# Altium footprint library 布洛电子PCB封装库-电阻电容电感.PcbLib: 59 footprints (part 3 of 4)
Each footprint in its own frame and in the unit in brackets; x right, y up, seen from the top. Pads: shape width x height; smd on the part's side, far side on the other; paste and mask are expansions set on the pad; w line width, h text height; cw(c..) or ccw(c..) is an arc to the next point about the centre after c.
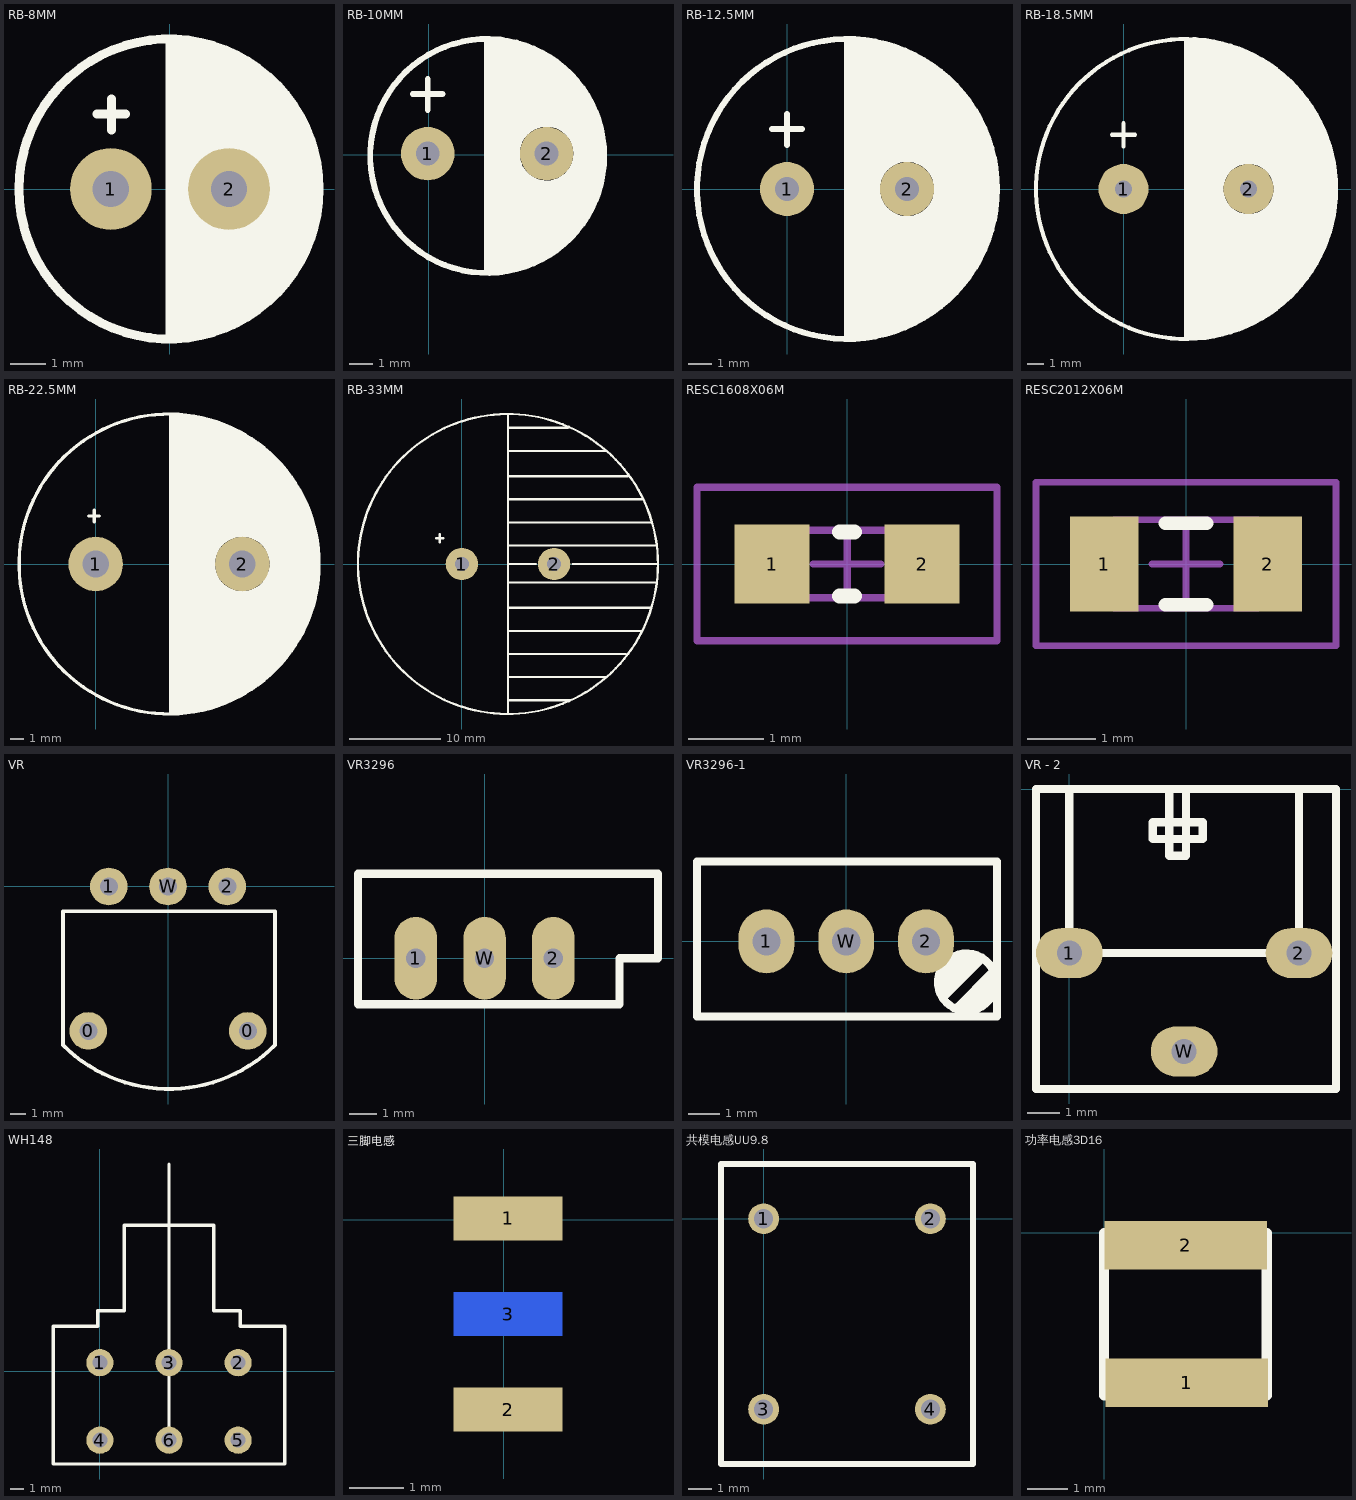
[diagram p2: the footprints below, top view; thin cyan lines are the x and y axes]

## RB-8MM [mil]
pads (2):
  round 90 hole 40: 1(-65,0) 2(65,0)
Top Overlay:
  circle w10: c-1,0 r165
  lines w10: -80.31,82.28 -48.82,82.28 ; -64.17,64.96 -64.17,99.21 ; 0,-165 0,164 ; 7,162 7,-161 8,-162 16,-162 16,158 25,158 25,-158 34,-158 34,156 43,156 43,-154 52,-154 52,151 61,151 61,-149 70,-149 70,144 78,136 78,-141 87,-132 87,135 96,126 96,-131 105,-122 105,124 114,115 114,-115 123,-106 123,-104 123,106 132,97 132,-96 ; 140,-82 140,79 140,67 149,58 149,-65 ; 157,-41 157,43
3D body: height 472.44, standoff -98.43, extent -158,-157.96 156.96,157

## RB-10MM [mil]
pads (2):
  round 90 hole 40: 1(-2,2) 2(198,2)
Top Overlay:
  circle w10: c198,2 r50
  circle w50: c198,2 r76.16
  circle w10: c98,-2 r196.85
  lines w10: -27.2,102 23.2,102 ; -2,75.62 -2,127.2 ; 98,193 98,-195 98,77 108,87
  lines w50: 118,-48 ccw(c223,-8) 227.2,-120.28 ; 118,132 cw(c150.5,69.5) 213,102 ; 118,151 cw(c150.5,88.5) 213,121 ; 120.18,-170.85 cw(c145.5,-175.5) 123,-163 ; 123,-118 ccw(c183,-123) 141.66,-166.77 ; 123,-88 ccw(c213,-68) 173,-151.07 ; 123,52 cw(c148,57) 143,82 ; 123,97 cw(c155.5,64.5) 188,97 ; 133,-28 ccw(c223,22) 251,-77.08 ; 134,139 cw(c166.5,76.5) 229,109 ; 160,101 cw(c192.5,38.5) 255,71 ; 118,174 ccw(c150.5,111.5) 118,174 ; 120,-177 ccw(c152.5,-239.5) 120,-177 ; 136,165 ccw(c168.5,102.5) 136,165 ; 152,-165 ccw(c184.5,-227.5) 152,-165 ; 162,-157 ccw(c194.5,-219.5) 162,-157 ; 181,-153 ccw(c213.5,-215.5) 181,-153 ; 204,-141 ccw(c236.5,-203.5) 204,-141 ; 244,-95 ccw(c276.5,-157.5) 244,-95 ; 262,-59 ccw(c294.5,-121.5) 262,-59

## RB-12.5MM [mil]
pads (2):
  round 90 hole 40: 1(0,0) 2(200,0)
Top Overlay:
  circle w50: c200,0 r76.16
  circle w10: c200,0 r50
  circle w10: c100,0 r250
  lines w10: -25.2,100 25.2,100 ; 0,73.62 0,125.2 ; 100,-250 100,245 ; 110,-245 100,-235 100,75 110,85 110,235 100,245 ; 120,245 100,245
  lines w50: 120,-50 ccw(c225,-10) 265,-115 ; 120,130 cw(c152.5,67.5) 215,100 ; 120,165 cw(c147.5,62.5) 250,90 ; 120,195 cw(c125,30) 290,35 ; 120,220 cw(c110,10) 320,0 cw(c110,-15) 125,-225 cw(c132.5,-217.5) 125,-210 ; 125,-165 ccw(c147.5,-177.5) 135,-200 ; 125,-120 ccw(c185,-125) 180,-185 ; 125,-90 ccw(c215,-70) 235,-160 ; 125,50 cw(c150,55) 145,80 ; 125,95 cw(c157.5,62.5) 190,95 ; 135,-30 ccw(c225,20) 275,-70 ; 285,-80 ccw(c270,-55) 295,-40

## RB-18.5MM [mil]
pads (2):
  round 120 hole 40: 1(0,0) 2(300,0)
Top Overlay:
  circle w50: c300,0 r103.08
  circle w10: c300,0 r75.17
  circle w10: c150,0 r360
  circle w50: c300,0 r85
  lines w10: -27.56,130.31 27.56,130.31 ; 0,102.36 0,157.87 ; 150,-360 150,360
  lines w15: 185,-320 185,-275
  lines w50: 170,-295 ccw(c197.5,-282.5) 210,-310 ; 170,-285 ccw(c162.5,-7.5) 440,0 ; 170,-245 ccw(c195,-45) 395,-70 ; 170,280 cw(c180,20) 440,30 ; 170,330 cw(c162.5,7.5) 485,0 ; 170,340 170,-335 ccw(c152.5,-7.5) 480,10 ; 180,-205 ccw(c207.5,-77.5) 335,-105 ; 180,-170 ccw(c207.5,-92.5) 285,-120 ; 180,240 cw(c202.5,42.5) 400,65 ; 185,-135 ccw(c205,-90) 250,-110 ; 185,-100 ccw(c200,-80) 220,-95 ; 185,135 cw(c240,100) 275,155 ; 185,190 cw(c235,110) 315,160 ; 195,-70 ccw(c215,-65) 220,-85 ; 195,90 cw(c287.5,27.5) 350,120 ; 200,-25 ccw(c235,-30) 230,-65 ; 315,-105 ccw(c355,-65) 395,-105

## RB-22.5MM [mil]
pads (2):
  round 160 hole 78: 1(0,0) 2(430,0)
Top Overlay:
  circle w100: c430,0 r129.71
  circle w10: c215,0 r440
  rectangle: 355,-80 370,-55
  rectangle: 305,-130 360,-40
  rectangle: 375,160 390,405
  rectangle: 355,145 375,415
  rectangle: 340,145 360,420
  rectangle: 315,120 345,425
  rectangle: 290,-430 325,430
  rectangle: 250,-435 295,435
  rectangle: 215,-440 250,435
  lines w10: -20.43,140.71 11.06,140.71 ; -4.29,123.39 -4.29,157.64
  lines w100: 270,-390 ccw(c240,-90) 540,-60 ; 275,315 cw(c352.5,122.5) 545,200 cw(c355,55) 340.8,-183.59 ; 305,-360 ccw(c305,-100) 565,-100 ; 305,-255 ccw(c401.2,-96.27) 566.2,-181.27 ; 316.17,-192.07 ccw(c395,5) 600,60 ; 330,235 cw(c372.5,87.5) 520,130 ; 360,170 cw(c420,120) 470,180 ; 360,365 cw(c200,5) 560,-155 ; 508.27,-174.94 ccw(c505,-80) 600,-80

## RB-33MM [mil]
pads (2):
  round 140 hole 60: 1(0,0) 2(400,0)
Top Overlay:
  circle w10: c200,0 r650
  lines w10: -111.42,111.42 -79.92,111.42 ; -95.28,94.09 -95.28,128.35 ; 200,-650 200,650 ; 200,-590 470,-590 ; 200,-490 620,-490 ; 200,-390 710,-390 ; 200,-290 780,-290 ; 200,-190 820,-190 ; 200,-80 840,-80 ; 200,0 320,0 ; 200,80 840,80 ; 200,180 820,180 ; 200,280 780,280 ; 200,380 720,380 ; 200,490 620,490 ; 200,590 460,590 ; 480,0 850,0

## RESC1608X06M [mm] "Chip Resistor, 2-Leads, Body 1.6x0.8mm, IPC Low Density"
height 0.6
pads (2):
  rect 1x1.05 smd: 1(-1,0) 2(1,0)
Top Overlay:
  lines w0.2: -0.1,-0.425 0.1,-0.425 ; -0.1,0.425 0.1,0.425
Mechanical 13:
  lines w0.1: -0.85,-0.45 0.85,-0.45 0.85,0.45 -0.85,0.45 -0.85,-0.45
Mechanical 15:
  lines w0.1: -0.45,0 0.45,0 ; 0,-0.45 0,0.45 ; -2,-1.025 2,-1.025 2,1.025 -2,1.025 -2,-1.025
3D body: height 0.55, standoff 0, extent -0.8,-0.4 0.8,0.4

## RESC2012X06M [mm] "Chip Resistor, 2-Leads, Body 2.0x1.2mm, IPC Low Density"
height 0.6
pads (2):
  rect 1x1.4 smd: 1(-1.2,0) 2(1.2,0)
Top Overlay:
  lines w0.2: -0.3,-0.6 0.3,-0.6 ; -0.3,0.6 0.3,0.6
Mechanical 13:
  lines w0.1: -1.05,-0.65 1.05,-0.65 1.05,0.65 -1.05,0.65 -1.05,-0.65
Mechanical 15:
  lines w0.1: -0.5,0 0.5,0 ; 0,-0.5 0,0.5 ; -2.2,-1.2 2.2,-1.2 2.2,1.2 -2.2,1.2 -2.2,-1.2
3D body: height 1, standoff 0, extent -1,-0.6 1,0.6

## VR [mm]
pads (5):
  round 2.5 hole 1.2: 0(-5.3,-9.6) 0(5.3,-9.6) 1(-3.937,0) 2(3.937,0) W(0,0)
Top Overlay:
  lines w0.254: -6.985,-10.541 ccw(c0.064,-3.492) 7.112,-10.541 7.112,-1.651 -6.985,-1.651 -6.985,-10.414
3D body: height 5.75, standoff 1.05, extent -8.89,-15.875 8.658,1.493

## VR3296 [mil]
pads (3):
  oval 62x120 hole 28: 1(-100,0) 2(100,0) W(0,0)
Top Overlay:
  lines w12: -184,-67 196,-67 196,0 252.09,0 252.09,123 -184,123 -184,-67
3D body: height 398.82, standoff -169.29, extent -186.09,-66.16 252.09,124

## VR3296-1 [mil]
pads (3):
  oval 70x80 hole 35.43: 1(-100,0) 2(100,0) W(0,0)
Top Overlay:
  circle w10: c151,-51 r36.06
  lines w10: 157.76,-74.24 164.24,-74.24 171,-81 ; 171,-21 151,-41 121,-71 121,-61 161,-21 141,-21 ; 172.88,-79.12 171,-81 ; 181,-41 141,-81 151,-81 ; 131,-31 121,-41 121,-51 141,-31 ; 131,-31 141,-21 ; 131,-31 141,-31 ; 141,-31 141,-21 ; 141,-31 151,-31 141,-21 ; 151,-81 171,-81 ; 151,-81 166.82,-65.18 172.88,-65.18 187.06,-51 187.06,-47.06 172.88,-61.23 170.77,-61.23 171,-61.47 171,-81 ; -187,-94 6,-94 189,-94 189,100 -187,100 -187,-94
3D body: height 452.76, standoff -161.42, extent -186.01,-92.94 188.01,98

## VR - 2 [mil]
pads (3):
  oval 80x60 hole 30: 1(0,-196.85) 2(275.59,-196.85) W(137.8,-314.96)
Top Overlay:
  lines w10: 120,0 120,-80 140,-80 140,0 ; 0,0 275.59,0 ; 0,0 0,-196.85 275.59,-196.85 275.59,0 ; 0,0 -40,0 -40,-360 320,-360 320,-300 320,0 275.59,0 ; 100,-60 160,-60 160,-40 100,-40 100,-60

## WH148 [mm]
pads (6):
  round 2 hole 1.1: 1(0,0.61) 2(10.16,0.61) 3(5.08,0.61) 4(0,-5.08) 5(10.16,-5.08) 6(5.08,-5.08)
Top Overlay:
  lines w0.254: 5.08,-5.08 5.08,0.406 ; 5.08,0.61 5.08,15.215 ; -3.429,-6.833 -3.429,3.277 -0.165,3.277 -0.165,4.42 -0.14,4.445 1.778,4.445 1.778,10.719 5.08,10.719 8.382,10.719 8.382,4.42 10.325,4.42 10.325,3.277 13.589,3.277 13.589,-6.807 13.564,-6.833 -3.429,-6.833
3D body: height 22.5, standoff -2, extent -3.42,-6.833 13.58,34.017

## 三脚电感 [mm]
pads (3):
  rect 2x0.8 smd: 1(0.076,0.025) 2(0.076,-3.48)
  rect 2x0.8 smd far side: 3(0.076,-1.727)

## 共模电感UU9.8 [mm]
pads (4):
  round 1.3 hole 0.8: 1(0,0) 2(7,0) 3(0,-8) 4(7,-8)
Top Overlay:
  lines w0.254: -1.8,-10.3 -1.8,-8 -1.8,2.3 8.8,2.3 8.8,-10.3 -1.8,-10.3
3D body: height 15.45, standoff -3, extent -1.96,-11.744 8.89,3.819

## 功率电感3D16 [mm]
pads (2):
  rect 4x1.2 smd: 1(2.032,-3.683) 2(2.007,-0.305)
Top Overlay:
  lines w0.254: 0,-4 4,-4 4,0 0,0 0,-4
3D body: height 1.15, standoff -0.05, extent 0.025,-3.995 4.001,-0.019